# Altium footprint library CTC1.PcbLib: 19 footprints (part 2 of 2)
Each footprint in its own frame and in the unit in brackets; x right, y up, seen from the top. Pads: shape width x height; smd on the part's side, far side on the other; paste and mask are expansions set on the pad; w line width, h text height; cw(c..) or ccw(c..) is an arc to the next point about the centre after c.
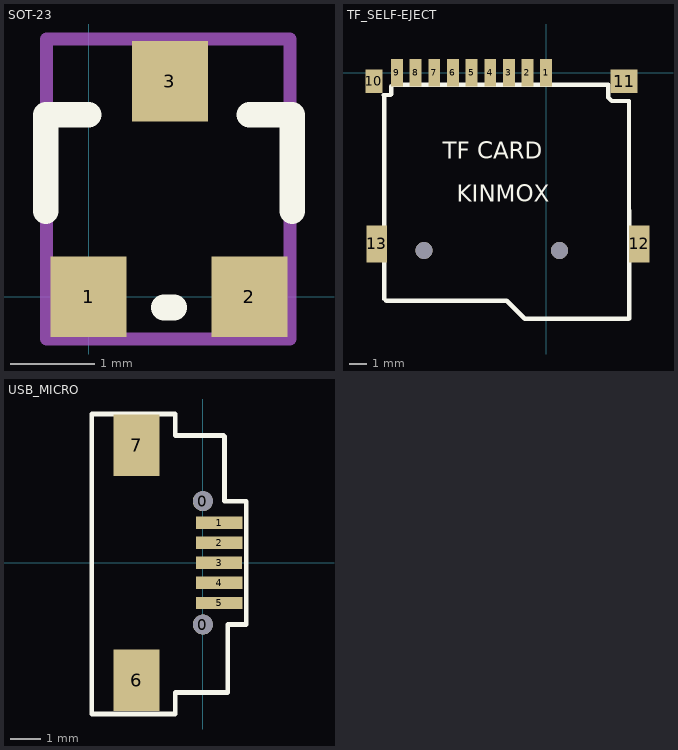
[diagram p1: the footprints below, top view; thin cyan lines are the x and y axes]

## SOT-23 [mm]
pads (3):
  rect 0.9x0.95 smd: 1(0,0) 2(1.905,0) 3(0.962,2.555)
Top Overlay:
  lines w0.305: -0.508,1.016 -0.508,2.159 0,2.159 ; 0.889,-0.127 1.016,-0.127 ; 1.905,2.159 2.413,2.159 2.413,1.016
Mechanical 13:
  lines w0.152: -0.5,-0.5 -0.5,3.055 2.387,3.055 2.387,-0.5 -0.5,-0.5
  text ".Designator" at -0.554,0.946 h0.51
Mechanical 15:
  lines w0.152: -0.5,-0.5 2.387,-0.5 2.387,3.055 -0.5,3.055 -0.5,-0.5
  text ".Comment" at -0.567,0.901 h0.51
3D body "SOT-23-3.STEP": height 1.2, standoff 0, extent -0.521,-0.196 2.379,2.604

## TF_SELF-EJECT [mm]
pads (13):
  rect 0.7x1.6 smd: 1(0,0) 2(-1.1,0) 3(-2.2,0) 4(-3.3,0) 5(-4.4,0) 6(-5.5,0) 7(-6.6,0) 8(-7.7,0) 9(-8.8,0)
  rect 1x1.4 smd: 10(-10.16,-0.508)
  rect 1.6x1.4 smd: 11(4.6,-0.5)
  rect 1.2x2.2 smd: 12(5.5,-10.1) 13(-10,-10.1)
via -7.2,-10.5 diameter 1 hole 1
via 0.8,-10.5 diameter 1 hole 1
Top Overlay:
  lines w0.254: 4.88,-14.52 -1.262,-14.52 -2.329,-13.453 -9.441,-13.453 -9.543,-13.351 -9.543,-1.362 -9.594,-1.312 -9.187,-1.312 -9.136,-1.261 -9.136,-0.804 -9.035,-0.702 3.665,-0.702 3.665,-1.464 3.868,-1.667 4.884,-1.667 4.9,-14.5
  text "KINMOX" at -5.276,-7.611 h1
  text "TF CARD" at -6.088,-5.071 h1
3D body "SW3dPS-Micro_SD.STEP": height 1.75, standoff 0.77, extent -8.5,-17.1 2.5,-2.1
3D body "User Library-MEM2055-00-190-01-A_revG.STEP": height 1.85, standoff -0.6, extent -10.2,-14.525 5.8,0.725

## USB_MICRO [mm]
pads (9):
  round 0.65 hole 0.65: 0(0,-2) 0(0,2)
  rect 1.5x0.4 smd: 1(0.525,1.3) 2(0.525,0.65) 3(0.521,0) 4(0.525,-0.65) 5(0.525,-1.3)
  rect 1.5x2 smd: 6(-2.15,-3.81) 7(-2.15,3.81)
Top Overlay:
  lines w0.152: 0.674,4.126 -0.9,4.126 -0.9,4.826 -3.6,4.826 -3.6,-4.9 -2.15,-4.9 -0.9,-4.9 -0.9,-4.2 0.8,-4.2 0.8,-2 1.4,-2 1.4,2 0.7,2 0.7,4.1
Mechanical 13:
  text ".Designator" at -1.246,-1.554 h0.51
Mechanical 15:
  text ".Comment" at -1.246,-1.554 h0.51
3D body "MICRO USB.STEP": height 2.77, standoff -0.17, extent -4.645,-4.083 1.285,4.117